# Altium schematic symbol library AD_Lib.SchLib: 1239 symbols (part 4 of 9)
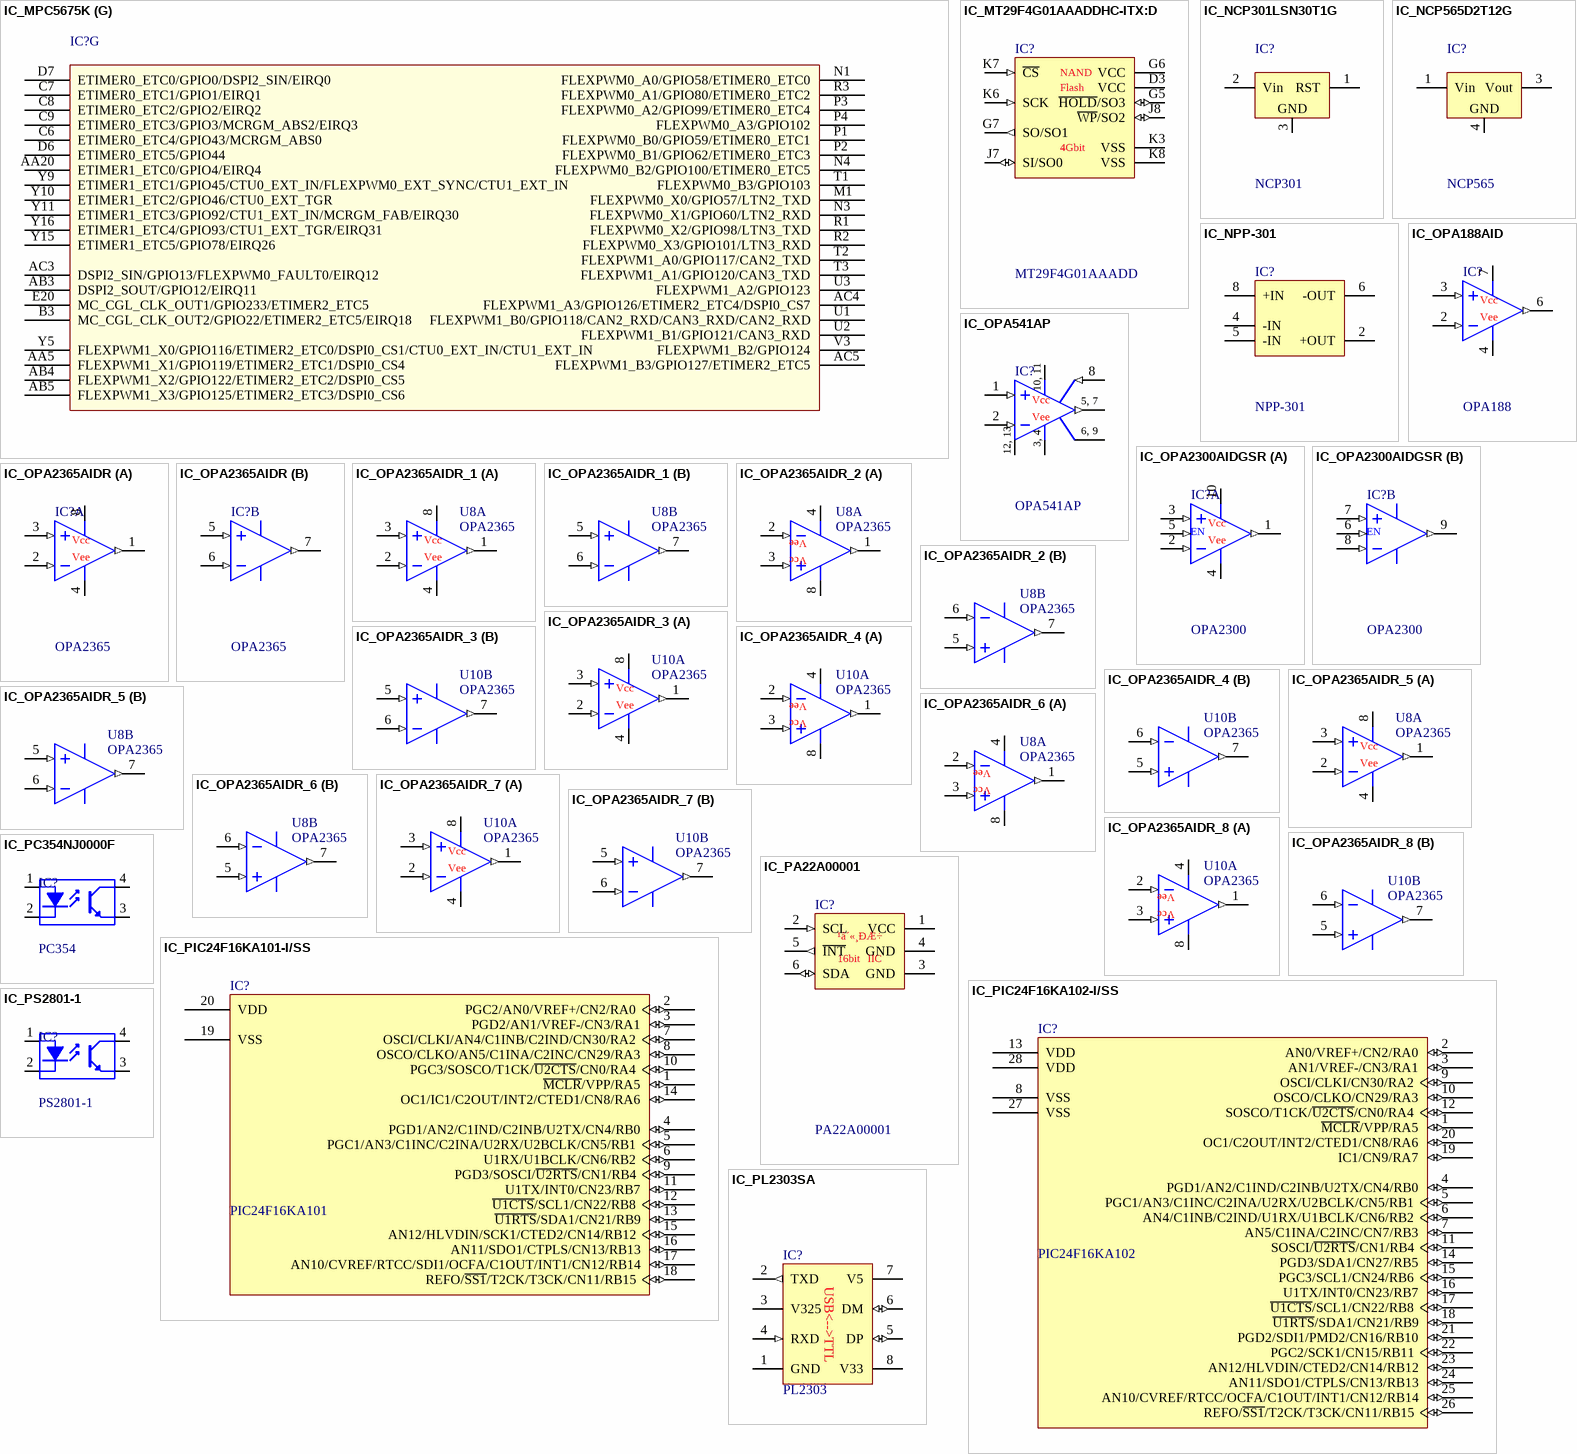
[diagram p45: symbols IC_MPC5675K to IC_PS2801-1]

## IC_MPC5675K
designator IC?, comment SPC5675
MCU; Manufacturer: Freescale; other: PowerPC Core,32bit; Value: 160MHz,3.3V; Quality: -40~125¡æ; pro-environment: RoHS; SN: 03.4.11.26.99567501S; OPN: SPC5675KFF0MMS2; PadsNum: 0; Category: ¼¯³ÉÐ¾Æ¬; Part: SPC5675; QTY: 420; Price: ?; OPN_JLC: OPN_JLC; SN_JLC: SN_JLC; Price_JLC: 0
footprint BGA-473 (BGA, 81-Leads, Body 19.0x19.0mm,  Pitch 0.80mm)
part A pins: A1 VSS_HV_IO, A2 VSS_HV_IO, A22 VSS_HV_IO, A23 VSS_HV_IO, AA3 VSS_HV_IO, AA10 VSS_HV_ADV, AA21 VSS_HV_IO, AB1 VSS_HV_IO, AB23 VSS_HV_IO, AC1 VSS_HV_IO, AC2 VSS_HV_IO, AC8 VSS_HV_ADR_23, AC13 VSS_HV_ADR_0, AC16 VSS_HV_ADR_1, AC19 VSS_HV_PMU, AC22 VSS_HV_IO, AC23 VSS_HV_IO, B1 VSS_HV_IO, B2 VSS_HV_IO, B14 VSS_HV_IO, B23 VSS_HV_IO, C3 VSS_HV_IO, C21 VSS_HV_PDI, D9 VSS_HV_IO, D12 VSS_HV_FLA, D17 VSS_HV_PDI, G7 VSS_LV_COR, G8 VSS_LV_COR, G9 VSS_LV_COR, G10 VSS_LV_COR, G11 VSS_LV_COR, G12 VSS_LV_COR, G13 VSS_LV_COR, G14 VSS_LV_COR, G15 VSS_LV_COR, G16 VSS_LV_COR, G17 VSS_LV_COR, H2 VSS_HV_IO, H7 VSS_LV_COR, H8 VSS_LV_COR, H9 VSS_LV_COR, H10 VSS_LV_COR, H11 VSS_LV_COR, H12 VSS_LV_COR, H13 VSS_LV_COR, H14 VSS_LV_COR, H15 VSS_LV_COR, H16 VSS_LV_COR, H17 VSS_LV_COR, H23 VSS_HV_DRAM, J7 VSS_LV_COR, J8 VSS_LV_COR, J9 VSS_LV_COR, J10 VSS_LV_COR, J11 VSS_LV_COR, J12 VSS_LV_COR, J13 VSS_LV_COR, J14 VSS_LV_COR, J15 VSS_LV_COR, J16 VSS_LV_COR, J17 VSS_LV_COR, K7 VSS_LV_COR, K8 VSS_LV_COR, K9 VSS_LV_COR, K10 VSS_LV_COR, K11 VSS_LV_COR, K12 VSS_LV_COR, K13 VSS_LV_COR, K14 VSS_LV_COR, K15 VSS_LV_COR, K16 VSS_LV_COR, K17 VSS_LV_COR, K20 VSS_HV_IO, L4 VSS_HV_IO, L7 VSS_LV_COR, L8 VSS_LV_COR, L9 VSS_LV_COR, L10 VSS_LV_COR, L11 VSS_LV_COR, L12 VSS_LV_COR, L13 VSS_LV_COR, L14 VSS_LV_COR, L15 VSS_LV_COR, L16 VSS_LV_COR, L17 VSS_LV_COR, L22 VSS_HV_DRAM, M7 VSS_LV_COR, M8 VSS_LV_COR, M9 VSS_LV_COR, M10 VSS_LV_COR, M11 VSS_LV_COR, M12 VSS_LV_COR, M13 VSS_LV_COR, M14 VSS_LV_COR, M15 VSS_LV_COR, M16 VSS_LV_COR, M17 VSS_LV_COR, N2 VSS_HV_IO, N7 VSS_LV_COR, N8 VSS_LV_COR, N9 VSS_LV_COR, N10 VSS_LV_COR, N11 VSS_LV_COR, N12 VSS_LV_COR, N13 VSS_LV_COR, N14 VSS_LV_COR, N15 VSS_LV_COR, N16 VSS_LV_COR, N17 VSS_LV_COR, P7 VSS_LV_COR, P8 VSS_LV_COR, P9 VSS_LV_COR, P10 VSS_LV_COR, P11 VSS_LV_COR, P12 VSS_LV_COR, P13 VSS_LV_COR, P14 VSS_LV_COR, P15 VSS_LV_COR, P16 VSS_LV_COR, P17 VSS_LV_COR, P22 VSS_HV_DRAM, R4 VSS_HV_IO, R7 VSS_LV_COR, R8 VSS_LV_COR, R9 VSS_LV_COR, R10 VSS_LV_COR, R11 VSS_LV_COR, R12 VSS_LV_COR, R13 VSS_LV_COR, R14 VSS_LV_COR, R15 VSS_LV_COR, R16 VSS_LV_COR, R17 VSS_LV_COR, T7 VSS_LV_COR, T8 VSS_LV_COR, T9 VSS_LV_COR, T10 VSS_LV_COR, T11 VSS_LV_COR, T12 VSS_LV_COR, T13 VSS_LV_COR, T14 VSS_LV_COR, T15 VSS_LV_COR, T16 VSS_LV_COR, T17 VSS_LV_COR, U7 VSS_LV_COR, U8 VSS_LV_COR, U9 VSS_LV_COR, U10 VSS_LV_COR, U11 VSS_LV_COR, U12 VSS_LV_COR, U13 VSS_LV_COR, U14 VSS_LV_COR, U15 VSS_LV_COR, U16 VSS_LV_COR, U17 VSS_LV_COR, V22 VSS_HV_DRAM, W2 VSS_HV_IO, W4 VSS_LV_PLL, Y1 VSS_HV_OSC, Y12 VSS_HV_IO
part B pins: A3 VDD_HV_IO, A14 VDD_HV_IO, AA9 VDD_HV_ADV, AB2 VDD_HV_IO, AB22 VDD_HV_IO, AC7 VDD_HV_ADR_23, AC12 VDD_HV_ADR_0, AC15 VDD_HV_ADR_1, AC17 VDD_HV_PMU, AC18 VREG_CTRL, AC20 RESET_SUPn (in), AC21 VREG_INT_ENABLEn (in), B22 VDD_HV_IO, C1 VDD_HV_IO, D8 VDD_HV_IO, D11 VPP_TEST, D13 VDD_HV_FLA, D16 VDD_HV_PDI, D20 VDD_HV_PDI, F6 VDD_LV_COR, F7 VDD_LV_COR, F8 VDD_LV_COR, F9 VDD_LV_COR, F10 VDD_LV_COR, F11 VDD_LV_COR, F12 VDD_LV_COR, F13 VDD_LV_COR, F14 VDD_LV_COR, F15 VDD_LV_COR, F16 VDD_LV_COR, F17 VDD_LV_COR, F18 VDD_LV_COR, G2 VDD_HV_IO, G6 VDD_LV_COR, G18 VDD_LV_COR, H6 VDD_LV_COR, H18 VDD_LV_COR, H21 VDD_HV_DRAM_VTT, H22 VDD_HV_DRAM, J6 VDD_LV_COR, J18 VDD_LV_COR, K6 VDD_LV_COR, K18 VDD_LV_COR, L6 VDD_LV_COR, L18 VDD_LV_COR, L20 VDD_HV_IO, L21 VDD_HV_DRAM_VTT, L23 VDD_HV_DRAM, M2 VDD_HV_IO, M4 VDD_HV_IO, M6 VDD_LV_COR, M18 VDD_LV_COR, N6 VDD_LV_COR, N18 VDD_LV_COR, P6 VDD_LV_COR, P18 VDD_LV_COR, P23 VDD_HV_DRAM, R6 VDD_LV_COR, R18 VDD_LV_COR, R20 VDD_HV_DRAM_VREF, T4 VDD_HV_IO, T6 VDD_LV_COR, T18 VDD_LV_COR, U6 VDD_LV_COR, U18 VDD_LV_COR, U22 VDD_HV_DRAM, V1 VDD_HV_OSC, V2 VDD_HV_IO, V6 VDD_LV_COR, V7 VDD_LV_COR, V8 VDD_LV_COR, V9 VDD_LV_COR, V10 VDD_LV_COR, V11 VDD_LV_COR, V12 VDD_LV_COR, V13 VDD_LV_COR, V14 VDD_LV_COR, V15 VDD_LV_COR, V16 VDD_LV_COR, V17 VDD_LV_COR, V18 VDD_LV_COR, Y4 VDD_LV_PLL, Y13 VDD_HV_IO, Y20 VDD_HV_IO
part C pins: A4 NPC_MDO[5]/GPIO114, A5 NPC_MDO[7]/GPIO112, A6 NPC_MDO[9]/GPIO110, AA1 XTALOUT, AA2 FCCU0_F0, AA19 TDI, AB18 TDO, AB19 TMS, AB20 RESERVED2, B5 NPC_MDO[14]/GPIO219/CAN3_TXD, C2 NPC_MDO[15]/GPIO220/CAN3_RXD/CAN2_RXD, C4 FCCU0_F1, D1 NPC_MDO[1]/GPIO86, D2 NPC_MDO[3]/GPIO84, D5 RESERVED1, D10 JCOMP, E1 NPC_MDO[0], E2 NPC_MDO[2]/GPIO85, E4 NMI, F1 NPC_MDO[10]/GPIO109, F2 NPC_MDO[11]/GPIO108, F3 NPC_MDO[6]/GPIO113, F4 NPC_MDO[4]/GPIO115, G1 NPC_MCKO/GPIO87, G3 NPC_MDO[8]/GPIO111, G4 NPC_MSEO_B1/GPIO88, H1 NPC_EVTOn/GPIO90, H3 NPC_MSEO_B0/GPIO89, H4 NPC_EVTIn/GPIO91, J1 NPC_RDYn/GPIO216, J2 NPC_MDO[13]/GPIO218/CAN2_RXD/CAN3_RXD, J3 NPC_MDO[12]/GPIO217/CAN2_TXD, W1 XTALIN, Y2 RESETn, Y19 TCK
part D pins: AA6 ADC3_AN1/GPI230, AA7 ADC2_3_AN12/GPI226, AA8 ADC2_AN0/GPI221, AA11 ADC0_AN2/GPI33, AA12 ADC0_AN5/GPI66, AA13 ADC0_AN8/GPI69, AA14 ADC0_1_AN12/GPI26, AA15 ADC1_AN0/GPI29/LIN1_RXD, AA16 ADC1_AN2/GPI31//EIRQ20, AA17 ADC1_AN5/GPI64, AA18 ADC1_AN7/GPI73, AB6 ADC3_AN2/GPI231, AB7 ADC2_3_AN13/GPI227, AB8 ADC2_AN1/GPI222, AB9 ADC2_AN2/GPI223, AB10 ADC0_AN0/GPI23/LIN0_RXD, AB11 ADC0_AN4/GPI70, AB12 ADC0_AN6/GPI71, AB13 ADC0_AN7/GPI68, AB14 ADC0_1_AN13/GPI27, AB15 ADC1_AN1/GPI30/ETIMER0_ETC4/EIRQ19, AB16 ADC1_AN3/GPI32, AB17 ADC1_AN4/GPI75, AC6 ADC3_AN3/GPI232, AC9 ADC2_AN3/GPI224, AC10 ADC0_AN1/GPI24/ETIMER0_ETC5, AC11 ADC0_AN3/GPI34, AC14 ADC0_1_AN14/GPI28, Y6 ADC3_AN0/GPI229, Y7 ADC2_3_AN11/GPI225, Y8 ADC2_3_AN14/GPI228, Y14 ADC0_1_AN11/GPI25, Y17 ADC1_AN8/GPI74, Y18 ADC1_AN6/GPI76
part E pins: A7 FLEXRAY_CB_TX/GPIO51, A8 FLEXRAY_CA_TR_EN/GPIO47/CTU0_EXT_IN/FLEXPWM0_EXT_SYNC, A9 FEC_RX_DV, A10 FEC_MDIO, A11 FEC_TX_CLK, A12 FEC_TX_EN, A13 FEC_TXD3, AA4 DSPI1_CS3/GPIO55/LIN2_TXD/DSPI0_CS4, AA22 LIN1_TXD/GPIO94/I2C1_CLOCK, AB21 LIN1_RXD/GPIO95/I2C1_DATA, B4 CAN1_TXD/GPIO14/EIRQ13, B6 DSPI2_CS1/GPIO9/FLEXPWM0_FAULT0/LIN3_RXD/CAN2_RXD, B7 FLEXRAY_CB_TR_EN/GPIO52, B8 FLEXRAY_CA_TX/GPIO48/CTU1_EXT_IN, B9 FEC_RXD3, B10 FEC_RX_ER, B11 FEC_TXD0, B12 FEC_RXD0, B13 FEC_TX_ER, B21 CAN0_TXD/GPIO16/SSCM_DEBUG0/EIRQ15, C5 FLEXRAY_CB_RX/GPIO50/CTU1_EXT_TGR, C10 FEC_TXD2, C11 FEC_TXD1, C12 FEC_CRS, C13 FEC_RX_CLK, C14 FEC_RXD1, C15 FEC_COL, C20 CAN0_RXD/GPIO17/SSCM_DEBUG1/CAN1_RXD/EIRQ16, D3 CAN1_RXD/GPIO15/CAN0_RXD/EIRQ14, D4 DSPI0_SOUT/GPIO38/SSCM_DEBUG6/EIRQ24, D14 FEC_RXD2, D15 FEC_MDO, E3 FLEXRAY_CA_RX/GPIO49/CTU0_EXT_TGR, J4 DSPI1_SIN/GPIO8/EIRQ8, K1 DSPI0_SCK/GPIO37/SSCM_DEBUG5/FLEXPWM0_FAULT3/EIRQ23, K2 DSPI1_CS0/GPIO5/DSPI0_CS7/EIRQ5, K3 DSPI1_SCK/GPIO6/EIRQ6, K4 DSPI1_SOUT/GPIO7/EIRQ7, L1 DSPI0_CS0/GPIO36/SSCM_DEBUG4/EIRQ22, L2 DSPI2_CS2/GPIO942/LIN3_TXD/CAN2_TXD/FLEXPWM0_FAULT1, L3 DSPI2_CS0/GPIO10/CAN3_TXD/EIRQ9, M3 DSPI0_SIN/GPIO39/SSCM_DEBUG7, U4 DSPI2_SCK/GPIO11/CAN3_RXD/EIRQ10, V4 DSPI1_CS2/GPIO56/DSPI0_CS5/FLEXPWM0_FAULT3/LIN2_RXD, V20 LIN0_TXD/GPIO18/I2C0_CLOCK/SSCM_DEBUG2/EIRQ17, W3 DSPI0_CS3/GPIO53/I2C2_CLOCK/FLEXPWM0_FAULT2, W20 LIN0_RXD/GPIO19/I2C0_DATA/SSCM_DEBUG3, Y3 DSPI0_CS2/GPIO54/I2C2_DATA/FLEXPWM0_FAULT1
part F pins: A15 PDI_DATA3/GPIO134/FLEXPWM2_X1, A16 PDI_DATA1/GPIO132/FLEXPWM2_B3, A17 PDI_CLOCK/GPIO128/FLEXPWM2_B1/ETIMER1_ETC3, A18 PDI_DATA7/GPIO138/FLEXPWM2_B2/ETIMER1_ETC5, A19 PDI_DATA10/GPIO141/FLEXPWM2_X3, A20 PDI_DATA13/GPIO144/PDI_SENS_SEL2/CTU1_EXT_TGR, A21 PDI_DATA15/GPIO146/PDI_SENS_SEL0/I2C2_DATA/CTU1_EXT_IN, AA23 DRAMC_ADD10/GPIO168/EBI_D2/EBI_ADD18, B15 PDI_DATA6/GPIO137/FLEXPWM2_B0/ETIMER1_ETC1, B16 PDI_DATA4/GPIO135/FLEXPWM2_A2/ETIMER1_ETC4, B17 PDI_DATA0/GPIO131/LIN3_TXD/FLEXPWM2_FAULT2, B18 PDI_LINE_V/GPIO129/LIN2_TXD/FLEXPWM2_FAULT0, B19 PDI_DATA9/GPIO140/FLEXPWM2_X2, B20 PDI_DATA14/GPIO145/PDI_SENS_SEL1/I2C2_COLCK, C16 PDI_DATA5/GPIO136/FLEXPWM2_A0/ETIMER1_ETC0, C17 PDI_DATA2/GPIO133/FLEXPWM2_A1/ETIMER1_ETC2, C18 PDI_DATA8/GPIO139/FLEXPWM2_A3, C19 PDI_DATA12/GPIO143/LIN3_RXD/FLEXPWM2_FAULT3, C22 GPIO197/FLEXPWM0_X0/EBI_D31, C23 DRAMC_CAS/GPIO152/EBI_WE_BE_1/FLEXPWM0_B2, D18 PDI_DATA11/GPIO142/FLEXPWM2_X0, D19 PDI_FRAME_V/GPIO130/LIN2_RXD/FLEXPWM2_FAULT1, D21 DRAMC_BA1/GPIO155/EBI_BDIP/FLEXPWM1_A0, D22 GPIO195/FLEXPWM0_X0/EBI_D29, D23 DRAMC_BA0/GPIO154/EBI_WE_BE_3/FLEXPWM0_B3, E21 GPIO149/EBI_RD_WR/FLEXPWM0_A1, E22 DRAMC_CS0/GPIO150/EBI_TS/FLEXPWM0_B1, E23 DRAMC_BA2/GPIO156/EBI_CS0/FLEXPWM1_B0, F20 DRAMC_RAS/GPIO151/EBI_WE_BE_0/FLEXPWM0_A2, F21 GPIO194/FLEXPWM0_X0/EBI_D28, F22 GPIO148/EBI_CLKOUT/FLEXPWM0_B0, F23 DRAMC_D5/GPIO179/EBI_D13/EBI_ADD29, G20 GPIO196/FLEXPWM0_X0/EBI_D30, G21 DRAMC_DQS0/GPIO190/EBI_D24, G22 DRAMC_DM0/GPIO192/EBI_D26, G23 DRAMC_D7/GPIO181/EBI_D15/EBI_ADD31, H20 DRAMC_D2/GPIO176/EBI_D10/EBI_ADD26, J20 DRAMC_D0/GPIO174/EBI_D8/EBI_ADD24, J21 DRAMC_D1/GPIO175/EBI_D9/EBI_ADD25, J22 DRAMC_D3/GPIO177/EBI_D11/EBI_ADD27, J23 DRAMC_D6/GPIO180/EBI_D14/EBI_ADD30, K21 DRAMC_D4/GPIO178/EBI_D12/EBI_ADD28, K22 DRAMC_D8/GPIO182/EBI_D16, K23 DRAMC_D9/GPIO183/EBI_D17, M20 DRAMC_ODT/GPIO157/EBI_CS1/FLEXPWM1_A1, M21 DRAMC_WEB/GPIO153/EBI_WE_BE_2/FLEXPWM0_A3, M22 DRAMC_D11/GPIO185/EBI_D19, M23 DRAMC_D10/GPIO184/EBI_D18, N20 DRAMC_DQS1/GPIO191/EBI_D25, N21 DRAMC_DM1/GPIO193/EBI_D27, N22 DRAMC_D13/GPIO187/EBI_D21, N23 DRAMC_D12/GPIO186/EBI_D20, P20 DRAMC_D14/GPIO188/EBI_D22, P21 DRAMC_D15/GPIO189/EBI_D23, R21 DRAMC_ADD3/GPIO161/EBI_ADD11/EBI_TEA, R22 DRAMC_CKE/GPIO147/EBI_OE/FLEXPWM0_A0, R23 DRAMC_CLKn, T20 DRAMC_ADD8/GPIO166/EBI_D0/EBI_ADD16, T21 DRAMC_ADD9/GPIO167/EBI_D1/EBI_ADD17, T22 DRAMC_ADD1/GPIO159/EBI_ADD9/EBI_CS3, T23 DRAMC_CLK, U20 DRAMC_ADD6/GPIO164/EBI_ADD14/FLEXPWM1_A2, U21 DRAMC_ADD12/GPIO170/EBI_D4/EBI_ADD20, U23 DRAMC_ADD0/GPIO158/EBI_ADD8/EBI_CS2, V21 DRAMC_ADD13/GPIO171/EBI_D5/EBI_ADD21, V23 DRAMC_ADD2/GPIO160/EBI_ADD10/EBI_TA, W21 DRAMC_ADD14/GPIO172/EBI_D6/EBI_ADD22, W22 DRAMC_ADD7/GPIO165/EBI_ADD15/FLEXPWM1_B2, W23 DRAMC_ADD4/GPIO162/EBI_ADD12/EBI_ALE, Y21 DRAMC_ADD15/GPIO173/EBI_D7/EBI_ADD23, Y22 DRAMC_ADD11/GPIO169/EBI_D3/EBI_ADD19, Y23 DRAMC_ADD5/GPIO163/EBI_ADD13/FLEXPWM1_B1
part G pins: AA5 FLEXPWM1_X1/GPIO119/ETIMER2_ETC1/DSPI0_CS4, AA20 ETIMER1_ETC0/GPIO4/EIRQ4, AB3 DSPI2_SOUT/GPIO12/EIRQ11, AB4 FLEXPWM1_X2/GPIO122/ETIMER2_ETC2/DSPI0_CS5, AB5 FLEXPWM1_X3/GPIO125/ETIMER2_ETC3/DSPI0_CS6, AC3 DSPI2_SIN/GPIO13/FLEXPWM0_FAULT0/EIRQ12, AC4 FLEXPWM1_A3/GPIO126/ETIMER2_ETC4/DSPI0_CS7, AC5 FLEXPWM1_B3/GPIO127/ETIMER2_ETC5, B3 MC_CGL_CLK_OUT2/GPIO22/ETIMER2_ETC5/EIRQ18, C6 ETIMER0_ETC4/GPIO43/MCRGM_ABS0, C7 ETIMER0_ETC1/GPIO1/EIRQ1, C8 ETIMER0_ETC2/GPIO2/EIRQ2, C9 ETIMER0_ETC3/GPIO3/MCRGM_ABS2/EIRQ3, D6 ETIMER0_ETC5/GPIO44, D7 ETIMER0_ETC0/GPIO0/DSPI2_SIN/EIRQ0, E20 MC_CGL_CLK_OUT1/GPIO233/ETIMER2_ETC5, M1 FLEXPWM0_X0/GPIO57/LTN2_TXD, N1 FLEXPWM0_A0/GPIO58/ETIMER0_ETC0, N3 FLEXPWM0_X1/GPIO60/LTN2_RXD, N4 FLEXPWM0_B2/GPIO100/ETIMER0_ETC5, P1 FLEXPWM0_B0/GPIO59/ETIMER0_ETC1, P2 FLEXPWM0_B1/GPIO62/ETIMER0_ETC3, P3 FLEXPWM0_A2/GPIO99/ETIMER0_ETC4, P4 FLEXPWM0_A3/GPIO102, R1 FLEXPWM0_X2/GPIO98/LTN3_TXD, R2 FLEXPWM0_X3/GPIO101/LTN3_RXD, R3 FLEXPWM0_A1/GPIO80/ETIMER0_ETC2, T1 FLEXPWM0_B3/GPIO103, T2 FLEXPWM1_A0/GPIO117/CAN2_TXD, T3 FLEXPWM1_A1/GPIO120/CAN3_TXD, U1 FLEXPWM1_B0/GPIO118/CAN2_RXD/CAN3_RXD/CAN2_RXD, U2 FLEXPWM1_B1/GPIO121/CAN3_RXD, U3 FLEXPWM1_A2/GPIO123, V3 FLEXPWM1_B2/GPIO124, Y5 FLEXPWM1_X0/GPIO116/ETIMER2_ETC0/DSPI0_CS1/CTU0_EXT_IN/CTU1_EXT_IN, Y9 ETIMER1_ETC1/GPIO45/CTU0_EXT_IN/FLEXPWM0_EXT_SYNC/CTU1_EXT_IN, Y10 ETIMER1_ETC2/GPIO46/CTU0_EXT_TGR, Y11 ETIMER1_ETC3/GPIO92/CTU1_EXT_IN/MCRGM_FAB/EIRQ30, Y15 ETIMER1_ETC5/GPIO78/EIRQ26, Y16 ETIMER1_ETC4/GPIO93/CTU1_EXT_TGR/EIRQ31

## IC_MT29F4G01AAADDHC-ITX:D
designator IC?, comment MT29F4G01AAADD
NAND Flash£¬4Gbit; Manufacturer: Micron; pro-environment: RoHS; Quality: -40~85¡æ; SN: 03.4.11.16.75MT2901S; Value: 4Gbit,2.7 V~3.6 V; OPN: MT29F4G01AAADDHCIT; PadsNum: 0; Category: ¼¯³ÉÐ¾Æ¬; Part: MT29F4G01AAADD; Price: ?; OPN_JLC: OPN_JLC; SN_JLC: SN_JLC; Price_JLC: 0
footprint VFBGA-63 (BGA, 63-Leads, Body 13.0x10.5mm,  Pitch 0.80mm)
pins: D3 VCC (power), G5 ~{HOLD}/SO3 (io), G6 VCC (power), G7 SO/SO1 (out), J7 SI/SO0 (io), J8 ~{WP}/SO2 (io), K3 VSS (power), K6 SCK (in), K7 ~{CS} (in), K8 VSS (power)
text: NAND; Flash; 4Gbit

## IC_NCP301LSN30T1G
designator IC?, comment NCP301
µçÔ´¼àÊÓ,3V; Manufacturer: ON; pro-environment: RoHS; Quality: -40~85¡æ; SN: 03.4.11.11.49301L01S; Value: 2.94~3.06V; OPN: NCP301LSN30T1G; PadsNum: 0; Category: ¼¯³ÉÐ¾Æ¬; Part: NCP301; QTY: 3000; Price: 1.2519; OPN_JLC: OPN_JLC; SN_JLC: SN_JLC; Price_JLC: 0
footprint SOT23-5 (SOT23, 5-Leads, Body 2.9x1.6mm, Pitch 0.95mm, Lead Span 2.7mm, IPC Low Density)
pins: 1 RST, 2 Vin, 3 GND (power)

## IC_NCP565D2T12G
designator IC?, comment NCP565
ÎÈÑ¹Ð¾Æ¬,LDO,1.2V/1.5A; Manufacturer: ON; pro-environment: RoHS; Quality: -40~125¡æ; Value: 9V,1.5A; OPN: NCP565D2T12G; PadsNum: 0; SN: SN; Category: ¼¯³ÉÐ¾Æ¬; Part: NCP565; QTY: 50; Price: 10.8342; OPN_JLC: OPN_JLC; SN_JLC: SN_JLC; Price_JLC: 0
footprint TO252-3 (D-PAK, 4-Leads, Body 6.1x6.5mm, Pitch 2.28mm, Lead Span 9.8mm, IPC Low Density)
pins: 1 Vin, 3 Vout, 4 GND (power)

## IC_NPP-301
designator IC?, comment NPP-301
Ñ¹Á¦´«¸ÐÆ÷; Pmax = 100psi; 0.1%; Vmax=60mV; Manufacturer: Amphenol; Quality: -40~125¡æ; Value: 100psi, 0.1%; pro-environment: RoHS; other: 100psi;0.1%;60mV; OPN: NPP-301A-700AT; PadsNum: 0; SN: SN; Category: ¼¯³ÉÐ¾Æ¬; Part: NPP-301; QTY: 2000; Price: 34.3592; OPN_JLC: OPN_JLC; SN_JLC: SN_JLC; Price_JLC: 0
footprint SO-8 (SOIC, 8-Leads, Body 4.9x3.9mm, Pitch 1.27mm, IPC Low Density)
pins: 2 +OUT, 4 -IN, 5 -IN, 6 -OUT, 8 +IN

## IC_OPA188AID
designator IC?, comment OPA188
OPA;1P;Io=18mA; Manufacturer: TI; Quality: -40~125¡æ; Value: 4V~36V;18mA; pro-environment: RoHS; other: Io=18mA;SR=0.8V/us; OPN: OPA188AID; PadsNum: 0; SN: SN; Category: ¼¯³ÉÐ¾Æ¬; Part: OPA188; QTY: 75; Price: 18.758; OPN_JLC: OPA188AIDR; SN_JLC: C85166; Price_JLC: 5.48
footprint SO-8 (SOIC, 8-Leads, Body 4.9x3.9mm, Pitch 1.27mm, IPC Low Density)
pins: 2 IN- (in), 3 IN+ (in), 4 VEE (power), 6 OUT (out), 7 VCC (power)
text: Vcc; Vee

## IC_OPA541AP
designator IC?, comment OPA541AP
¹¦ÂÊÔË·Å; Io=5A; 20~70V; Manufacturer: TI; Quality: -25~85¡æ; Value: 20V~70V; pro-environment: RoHS; other: Io=5A;SR=10V/us; PadsNum: 0; SN: SN; Category: ¼¯³ÉÐ¾Æ¬; OPN: OPA541AP; Part: OPA541AP; QTY: 25; Price: 155.7972; OPN_JLC: OPN_JLC; SN_JLC: SN_JLC; Price_JLC: 0
footprint TO220-11_HT (TO, Thru-Hole, Vertical, Heatsink Mounted; 11 Bent Staggered Leads; Pitch 1.7 mm)
pins: 1 IN+ (in), 2 IN- (in), 3 V- (power), 4 V- (power), 5 O DRV (out), 6 NC, 7 O DRV (out), 8 ISEN (in), 9 NC, 10 +V (power), 11 +V (power), 12, 13
text: 10, 11; Vcc; 5, 7; Vee; 6, 9; 3, 4; 12, 13

## IC_OPA2300AIDGSR
designator IC?, comment OPA2300
OPA; 2P; 80V/us; Io=9.5mA; Manufacturer: TI; Quality: -40~85¡æ; Value: 2.7V~5.5V; pro-environment: RoHS; other: Io=9.5mA;SR=80V/us; OPN: OPA2300AIDGSR; PadsNum: 0; SN: SN; Category: ¼¯³ÉÐ¾Æ¬; Part: OPA2300; QTY: 2500; Price: 9.0626; OPN_JLC: OPN_JLC; SN_JLC: SN_JLC; Price_JLC: 0
footprint VSSOP-10 (Shrink Small Outline; 10 Leads; Body Width 3 mm; Pitch 0.5 mm)
part A pins: 1 OUTA (out), 2 INA- (in), 3 INA+ (in), 4 VEE (power), 5 EA (in), 10 VCC (power)
part B pins: 6 ENB (in), 7 INB+ (in), 8 INB- (in), 9 OUTB (out)
part A text: Vcc; EN; Vee
part B text: EN

## IC_OPA2365AIDR
designator IC?, comment OPA2365
OPA; 2P; Vi=2.2~5.5V; Io=65mA; SR=25V/us; Manufacturer: TI; Quality: -40~85¡æ; pro-environment: RoHS; OPN: OPA2365AIDR; PadsNum: 8; Value: 2.2~5.5V; SN: SN; other: Io=65mA;SR=25V/us; Category: ¼¯³ÉÐ¾Æ¬; Part: OPA2365; QTY: 2500; Price: 8.4072; OPN_JLC: OPA2365AIDR; SN_JLC: C130011; Price_JLC: 5.03
footprint SO-8 (SOIC, 8-Leads, Body 4.9x3.9mm, Pitch 1.27mm, IPC Low Density)
part A pins: 1 OUTA (out), 2 INA- (in), 3 INA+ (in), 4 VEE (power), 8 VCC (power)
part B pins: 5 INB+ (in), 6 INB- (in), 7 OUTB (out)
part A text: Vcc; Vee

## IC_OPA2365AIDR_1
designator U8, comment OPA2365
OPA; 2P; Vi=2.2~5.5V; Io=65mA; SR=25V/us; Manufacturer: TI; Quality: -40~85¡æ; pro-environment: RoHS; OPN: OPA2365AIDR; PadsNum: 8; Value: 2.2~5.5V; SN: SN; other: Io=65mA;SR=25V/us; Category: ¼¯³ÉÐ¾Æ¬; Part: OPA2365; QTY: 2500; Price: 8.4072; OPN_JLC: OPA2365AIDR; SN_JLC: C130011; Price_JLC: 5.03
footprint SO-8 (SOIC, 8-Leads, Body 4.9x3.9mm, Pitch 1.27mm, IPC Low Density)
part A pins: 1 OUTA (out), 2 INA- (in), 3 INA+ (in), 4 VEE (power), 8 VCC (power)
part B pins: 5 INB+ (in), 6 INB- (in), 7 OUTB (out)
part A text: Vcc; Vee

## IC_OPA2365AIDR_2
designator U8, comment OPA2365
OPA; 2P; Vi=2.2~5.5V; Io=65mA; SR=25V/us; Manufacturer: TI; Quality: -40~85¡æ; pro-environment: RoHS; OPN: OPA2365AIDR; PadsNum: 8; Value: 2.2~5.5V; SN: SN; other: Io=65mA;SR=25V/us; Category: ¼¯³ÉÐ¾Æ¬; Part: OPA2365; QTY: 2500; Price: 8.4072; OPN_JLC: OPA2365AIDR; SN_JLC: C130011; Price_JLC: 5.03
footprint SO-8 (SOIC, 8-Leads, Body 4.9x3.9mm, Pitch 1.27mm, IPC Low Density)
part A pins: 1 OUTA (out), 2 INA- (in), 3 INA+ (in), 4 VEE (power), 8 VCC (power)
part B pins: 5 INB+ (in), 6 INB- (in), 7 OUTB (out)
part A text: Vee; Vcc

## IC_OPA2365AIDR_3
designator U10, comment OPA2365
OPA; 2P; Io=0.31A; Manufacturer: TI; Quality: -40~85¡æ; Value: ¡À1.5V~¡À12V;3V~24V;; pro-environment: RoHS; other: Io=310mA;SR=53V/us; OPN: OPA2365AIDR; PadsNum: 8; SN: SN; Category: ¼¯³ÉÐ¾Æ¬; Part: OPA2365; QTY: 98; Price: ?; OPN_JLC: OPA2365AIDR; SN_JLC: C130011; Price_JLC: 5.03
footprint SO-8 (SOIC, 8-Leads, Body 4.9x3.9mm, Pitch 1.27mm, IPC Low Density)
part A pins: 1 OUTA (out), 2 INA- (in), 3 INA+ (in), 4 VEE (power), 8 VCC (power)
part B pins: 5 INB+ (in), 6 INB- (in), 7 OUTB (out)
part A text: Vcc; Vee

## IC_OPA2365AIDR_4
designator U10, comment OPA2365
OPA; 2P; Io=0.31A; Manufacturer: TI; Quality: -40~85¡æ; Value: ¡À1.5V~¡À12V;3V~24V;; pro-environment: RoHS; other: Io=310mA;SR=53V/us; OPN: OPA2365AIDR; PadsNum: 8; SN: SN; Category: ¼¯³ÉÐ¾Æ¬; Part: OPA2365; QTY: 98; Price: ?; OPN_JLC: OPA2365AIDR; SN_JLC: C130011; Price_JLC: 5.03
footprint SO-8 (SOIC, 8-Leads, Body 4.9x3.9mm, Pitch 1.27mm, IPC Low Density)
part A pins: 1 OUTA (out), 2 INA- (in), 3 INA+ (in), 4 VEE (power), 8 VCC (power)
part B pins: 5 INB+ (in), 6 INB- (in), 7 OUTB (out)
part A text: Vee; Vcc

## IC_OPA2365AIDR_5
designator U8, comment OPA2365
OPA; 2P; Vi=2.2~5.5V; Io=65mA; SR=25V/us; Manufacturer: TI; Quality: -40~85¡æ; pro-environment: RoHS; OPN: OPA2365AIDR; PadsNum: 8; Value: 2.2~5.5V; SN: SN; other: Io=65mA;SR=25V/us; Category: ¼¯³ÉÐ¾Æ¬; Part: OPA2365; QTY: 2500; Price: 8.4072; OPN_JLC: OPA2365AIDR; SN_JLC: C130011; Price_JLC: 5.03
footprint SO-8 (SOIC, 8-Leads, Body 4.9x3.9mm, Pitch 1.27mm, IPC Low Density)
part A pins: 1 OUTA (out), 2 INA- (in), 3 INA+ (in), 4 VEE (power), 8 VCC (power)
part B pins: 5 INB+ (in), 6 INB- (in), 7 OUTB (out)
part A text: Vcc; Vee

## IC_OPA2365AIDR_6
designator U8, comment OPA2365
OPA; 2P; Vi=2.2~5.5V; Io=65mA; SR=25V/us; Manufacturer: TI; Quality: -40~85¡æ; pro-environment: RoHS; OPN: OPA2365AIDR; PadsNum: 8; Value: 2.2~5.5V; SN: SN; other: Io=65mA;SR=25V/us; Category: ¼¯³ÉÐ¾Æ¬; Part: OPA2365; QTY: 2500; Price: 8.4072; OPN_JLC: OPA2365AIDR; SN_JLC: C130011; Price_JLC: 5.03
footprint SO-8 (SOIC, 8-Leads, Body 4.9x3.9mm, Pitch 1.27mm, IPC Low Density)
part A pins: 1 OUTA (out), 2 INA- (in), 3 INA+ (in), 4 VEE (power), 8 VCC (power)
part B pins: 5 INB+ (in), 6 INB- (in), 7 OUTB (out)
part A text: Vee; Vcc

## IC_OPA2365AIDR_7
designator U10, comment OPA2365
OPA; 2P; Io=0.31A; Manufacturer: TI; Quality: -40~85¡æ; Value: ¡À1.5V~¡À12V;3V~24V;; pro-environment: RoHS; other: Io=310mA;SR=53V/us; OPN: OPA2365AIDR; PadsNum: 8; SN: SN; Category: ¼¯³ÉÐ¾Æ¬; Part: OPA2365; QTY: 98; Price: ?; OPN_JLC: OPA2365AIDR; SN_JLC: C130011; Price_JLC: 5.03
footprint SO-8 (SOIC, 8-Leads, Body 4.9x3.9mm, Pitch 1.27mm, IPC Low Density)
part A pins: 1 OUTA (out), 2 INA- (in), 3 INA+ (in), 4 VEE (power), 8 VCC (power)
part B pins: 5 INB+ (in), 6 INB- (in), 7 OUTB (out)
part A text: Vcc; Vee

## IC_OPA2365AIDR_8
designator U10, comment OPA2365
OPA; 2P; Io=0.31A; Manufacturer: TI; Quality: -40~85¡æ; Value: ¡À1.5V~¡À12V;3V~24V;; pro-environment: RoHS; other: Io=310mA;SR=53V/us; OPN: OPA2365AIDR; PadsNum: 8; SN: SN; Category: ¼¯³ÉÐ¾Æ¬; Part: OPA2365; QTY: 98; Price: ?; OPN_JLC: OPA2365AIDR; SN_JLC: C130011; Price_JLC: 5.03
footprint SO-8 (SOIC, 8-Leads, Body 4.9x3.9mm, Pitch 1.27mm, IPC Low Density)
part A pins: 1 OUTA (out), 2 INA- (in), 3 INA+ (in), 4 VEE (power), 8 VCC (power)
part B pins: 5 INB+ (in), 6 INB- (in), 7 OUTB (out)
part A text: Vee; Vcc

## IC_PA22A00001
designator IC?, comment PA22A00001
¹â´«¸ÐÆ÷; 16bit; 2.7~3.3V; I2C;; Manufacturer: TXC; pro-environment: RoHS; Quality: -40~85¡æ; Value: 16bit,2.7~3.3V,IIC; PadsNum: 0; SN: SN; Category: ¼¯³ÉÐ¾Æ¬; OPN: PA22A00001; Part: PA22A00001; QTY: 3000; other: ¹â´«¸ÐÆ÷; 16bit; 2.7~3.3V; I2C;; Price: 1.2; OPN_JLC: OPN_JLC; SN_JLC: SN_JLC; Price_JLC: 0
footprint PA22A00001 (TXCÖ®¹â´«¸ÐÆ÷)
pins: 1 VCC (power), 2 SCL (in), 3 GND (power), 4 GND (power), 5 ~{INT} (out), 6 SDA (io)
text: ¹â´«¸ÐÆ÷; 16bit; IIC

## IC_PC354NJ0000F
designator IC?, comment PC354
¹âñî; 80V; 1mA; 18us/18us; Manufacturer: Sharp; pro-environment: RoHS; Quality: -55~100¡æ; OPN: PC354NJ0000F; PadsNum: 4; SN: SN; Value: 18us/18us; Category: ¼¯³ÉÐ¾Æ¬; Part: PC354; QTY: 3000; Price: 2.147; OPN_JLC: PC354NJ0000F; SN_JLC: C114904; Price_JLC: 1.56
footprint SO-4W (Pitch=100mil£¬ÈçHCPL-181)
pins: 1 A "Anode", 2 K "Cathode", 3 E "Emitter", 4 C "Collector"

## IC_PIC24F16KA101-I/SS
designator IC?, comment PIC24F16KA101
MCU; 16bit; 32MHz; 16 KB Flash; 1.5 KB RAM; Manufacturer: Microchip; pro-environment: RoHS; Quality: -40~85¡æ; Value: 16bit MCU;32MHz;16 KB Flash, 1.5 KB RAM; OPN: PIC24F16KA101-I/SS; PadsNum: 0; SN: SN; Category: ¼¯³ÉÐ¾Æ¬; Part: PIC24F16KA101; QTY: 47; Price: 16.5204; OPN_JLC: OPN_JLC; SN_JLC: SN_JLC; Price_JLC: 0
footprint SSOP-20_W5.3 (SOP, 20-Leads, Body 7.2x5.3mm, Pitch 0.65mm, IPC Low Density)
pins: 1 ~{MCLR}/VPP/RA5 (io), 2 PGC2/AN0/VREF+/CN2/RA0 (io), 3 PGD2/AN1/VREF-/CN3/RA1 (io), 4 PGD1/AN2/C1IND/C2INB/U2TX/CN4/RB0 (io), 5 PGC1/AN3/C1INC/C2INA/U2RX/U2BCLK/CN5/RB1 (io), 6 U1RX/U1BCLK/CN6/RB2 (io), 7 OSCI/CLKI/AN4/C1INB/C2IND/CN30/RA2 (io), 8 OSCO/CLKO/AN5/C1INA/C2INC/CN29/RA3 (io), 9 PGD3/SOSCI/~{U2RTS}/CN1/RB4 (io), 10 PGC3/SOSCO/T1CK/~{U2CTS}/CN0/RA4 (io), 11 U1TX/INT0/CN23/RB7 (io), 12 ~{U1CTS}/SCL1/CN22/RB8 (io), 13 ~{U1RTS}/SDA1/CN21/RB9 (io), 14 OC1/IC1/C2OUT/INT2/CTED1/CN8/RA6 (io), 15 AN12/HLVDIN/SCK1/CTED2/CN14/RB12 (io), 16 AN11/SDO1/CTPLS/CN13/RB13 (io), 17 AN10/CVREF/RTCC/SDI1/OCFA/C1OUT/INT1/CN12/RB14 (io), 18 REFO/~{SS1}/T2CK/T3CK/CN11/RB15 (io), 19 VSS (power), 20 VDD (power)

## IC_PIC24F16KA102-I/SS
designator IC?, comment PIC24F16KA102
MCU; 16bit; 32MHz; 16 KB Flash; 1.5 KB RAM; Manufacturer: Microchip; pro-environment: RoHS; Quality: -40~85¡æ; Value: 16bit MCU;32MHz;16 KB Flash, 1.5 KB RAM; OPN: PIC24F16KA102-I/SS; PadsNum: 0; SN: SN; Category: ¼¯³ÉÐ¾Æ¬; Part: PIC24F16KA102; QTY: 47; Price: 16.5204; OPN_JLC: OPN_JLC; SN_JLC: SN_JLC; Price_JLC: 0
footprint SSOP-28_W5.3 (SSOP, Plastic; 28 Leads; Body Width 5.3 mm; Pitch 0.65 mm)
pins: 1 ~{MCLR}/VPP/RA5 (io), 2 AN0/VREF+/CN2/RA0 (io), 3 AN1/VREF-/CN3/RA1 (io), 4 PGD1/AN2/C1IND/C2INB/U2TX/CN4/RB0 (io), 5 PGC1/AN3/C1INC/C2INA/U2RX/U2BCLK/CN5/RB1 (io), 6 AN4/C1INB/C2IND/U1RX/U1BCLK/CN6/RB2 (io), 7 AN5/C1INA/C2INC/CN7/RB3 (io), 8 VSS (power), 9 OSCI/CLKI/CN30/RA2 (io), 10 OSCO/CLKO/CN29/RA3 (io), 11 SOSCI/~{U2RTS}/CN1/RB4 (io), 12 SOSCO/T1CK/~{U2CTS}/CN0/RA4 (io), 13 VDD (power), 14 PGD3/SDA1/CN27/RB5 (io), 15 PGC3/SCL1/CN24/RB6 (io), 16 U1TX/INT0/CN23/RB7 (io), 17 ~{U1CTS}/SCL1/CN22/RB8 (io), 18 ~{U1RTS}/SDA1/CN21/RB9 (io), 19 IC1/CN9/RA7 (io), 20 OC1/C2OUT/INT2/CTED1/CN8/RA6 (io), 21 PGD2/SDI1/PMD2/CN16/RB10 (io), 22 PGC2/SCK1/CN15/RB11 (io), 23 AN12/HLVDIN/CTED2/CN14/RB12 (io), 24 AN11/SDO1/CTPLS/CN13/RB13 (io), 25 AN10/CVREF/RTCC/OCFA/C1OUT/INT1/CN12/RB14 (io), 26 REFO/~{SS1}/T2CK/T3CK/CN11/RB15 (io), 27 VSS (power), 28 VDD (power)

## IC_PL2303SA
designator IC?, comment PL2303
USB Bridge; 4.5~6.5V; Manufacturer: Prolific; Quality: -40~125¡æ; pro-environment: RoHS; SN: 03.4.11.17.82821601S; other: Vin=-4.5V~6.5V; OPN: PL2303SA; PadsNum: 0; Value: 4.5~6.5V; Category: ¼¯³ÉÐ¾Æ¬; Part: PL2303; Price: ?; OPN_JLC: OPN_JLC; SN_JLC: SN_JLC; Price_JLC: 0
footprint SO-8 (SOIC, 8-Leads, Body 4.9x3.9mm, Pitch 1.27mm, IPC Low Density)
pins: 1 GND (power), 2 TXD (out), 3 V325 (power), 4 RXD (in), 5 DP (io), 6 DM (io), 7 V5 (power), 8 V33 (power)
text: USB<-->TTL

## IC_PS2801-1
designator IC?, comment PS2801-1
Í¨ÓÃ¹âñî; Manufacturer: NEC; pro-environment: RoHS; Quality: -55~100¡æ; SN: 03.4.23.11.47280101S; OPN: PS2801-1-F3; PadsNum: 0; part: PS2801-1; Price: 2.0592; QTY: 3500; OPN_JLC: OPN_JLC; SN_JLC: SN_JLC; Price_JLC: 0
footprint SO-4 (SSOP-4£¬Pitch=50mil¡£ÈçPS2801-1)
pins: 1 A "Anode", 2 K "Cathode", 3 E "Emitter", 4 C "Collector"

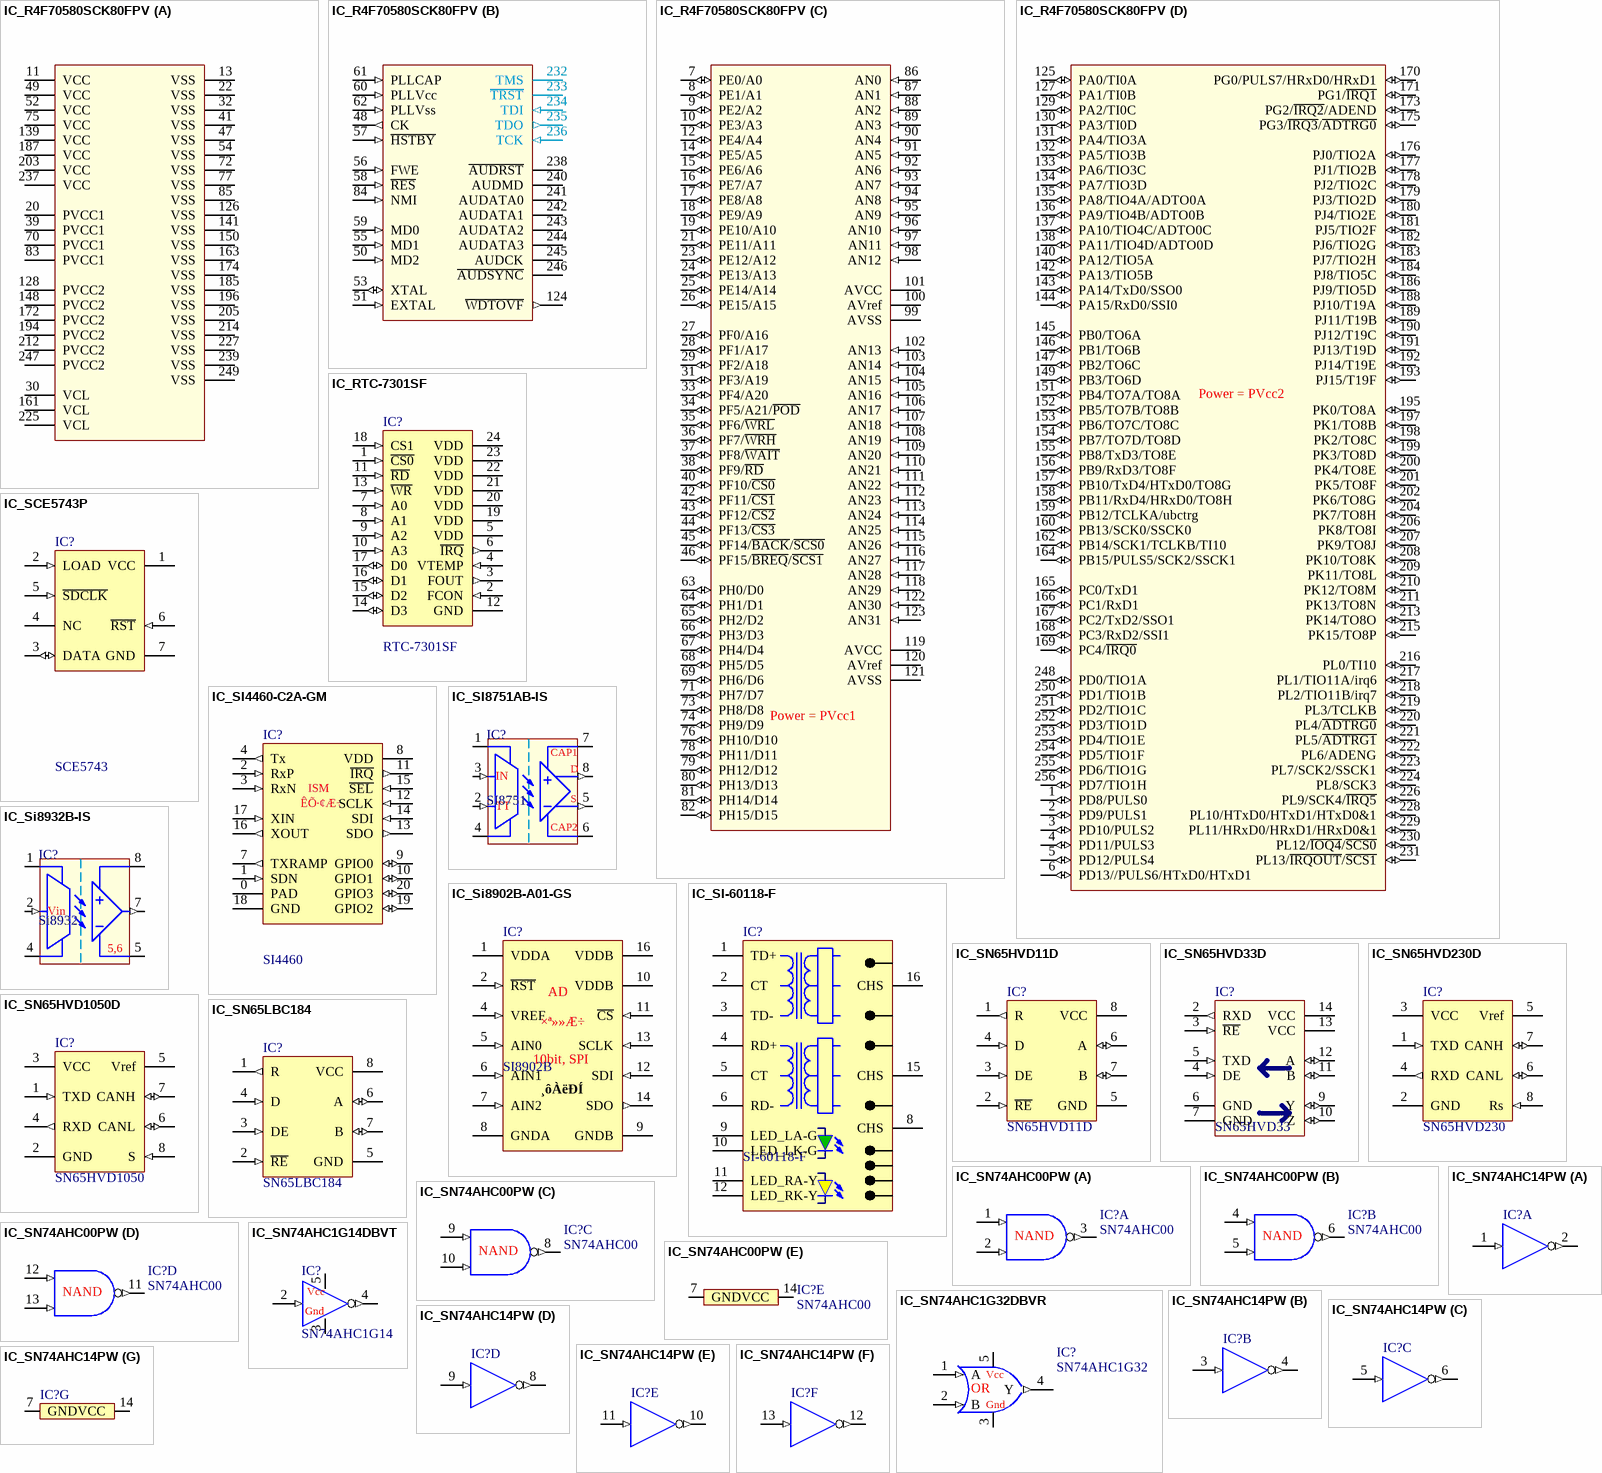
[diagram p17: symbols IC_R4F70580SCK80FPV to IC_SN74AHC14PW]

## IC_R4F70580SCK80FPV
designator IC?, comment SH7058H  (value not drawn)
MCU; 32bit; Manufacturer: Renesas; Quality: -55¡æ~125¡æ; Other: ´¦ÀíÆ÷; SN: 03.4.11.26.70705802S; pre-environment: RoHS; OPN: R4F70580SCK80FPV; PadsNum: 0; part: SH7058H; Price: ?; OPN_JLC: OPN_JLC; SN_JLC: SN_JLC; Price_JLC: 0
footprint SH7058S
part A pins: 11 VCC (power), 13 VSS (power), 20 PVCC1 (power), 22 VSS (power), 30 VCL (power), 32 VSS (power), 39 PVCC1 (power), 41 VSS (power), 47 VSS (power), 49 VCC (power), 52 VCC (power), 54 VSS (power), 70 PVCC1 (power), 72 VSS (power), 75 VCC (power), 77 VSS (power), 83 PVCC1 (power), 85 VSS (power), 126 VSS (power), 128 PVCC2 (power), 139 VCC (power), 141 VSS (power), 148 PVCC2 (power), 150 VSS (power), 161 VCL (power), 163 VSS (power), 172 PVCC2 (power), 174 VSS (power), 185 VSS (power), 187 VCC (power), 194 PVCC2 (power), 196 VSS (power), 203 VCC (power), 205 VSS (power), 212 PVCC2 (power), 214 VSS (power), 225 VCL (power), 227 VSS (power), 237 VCC (power), 239 VSS (power), 247 PVCC2 (power), 249 VSS (power)
part B pins: 48 CK (out), 50 MD2 (in), 51 EXTAL (in), 53 XTAL (io), 55 MD1 (in), 56 FWE (in), 57 ~{HSTBY} (in), 58 ~{RES} (in), 59 MD0 (in), 60 PLLVcc (in), 61 PLLCAP (in), 62 PLLVss (in), 84 NMI (in), 124 ~{WDTOVF} (out), 232 TMS, 233 ~{TRST}, 234 TDI (in), 235 TDO (out), 236 TCK (in), 238 ~{AUDRST}, 240 AUDMD, 241 AUDATA0, 242 AUDATA1, 243 AUDATA2, 244 AUDATA3, 245 AUDCK, 246 ~{AUDSYNC}
part C pins: 7 PE0/A0 (io), 8 PE1/A1 (io), 9 PE2/A2 (io), 10 PE3/A3 (io), 12 PE4/A4 (io), 14 PE5/A5 (io), 15 PE6/A6 (io), 16 PE7/A7 (io), 17 PE8/A8 (io), 18 PE9/A9 (io), 19 PE10/A10 (io), 21 PE11/A11 (io), 23 PE12/A12 (io), 24 PE13/A13 (io), 25 PE14/A14 (io), 26 PE15/A15 (io), 27 PF0/A16 (io), 28 PF1/A17 (io), 29 PF2/A18 (io), 31 PF3/A19 (io), 33 PF4/A20 (io), 34 PF5/A21/~{POD} (io), 35 PF6/~{WRL} (io), 36 PF7/~{WRH} (io), 37 PF8/~{WAIT} (io), 38 PF9/~{RD} (io), 40 PF10/~{CS0} (io), 42 PF11/~{CS1} (io), 43 PF12/~{CS2} (io), 44 PF13/~{CS3} (io), 45 PF14/~{BACK}/~{SCS0} (io), 46 PF15/~{BREQ}/~{SCS1} (io), 63 PH0/D0 (io), 64 PH1/D1 (io), 65 PH2/D2 (io), 66 PH3/D3 (io), 67 PH4/D4 (io), 68 PH5/D5 (io), 69 PH6/D6 (io), 71 PH7/D7 (io), 73 PH8/D8 (io), 74 PH9/D9 (io), 76 PH10/D10 (io), 78 PH11/D11 (io), 79 PH12/D12 (io), 80 PH13/D13 (io), 81 PH14/D14 (io), 82 PH15/D15 (io), 86 AN0 (in), 87 AN1 (in), 88 AN2 (in), 89 AN3 (in), 90 AN4 (in), 91 AN5 (in), 92 AN6 (in), 93 AN7 (in), 94 AN8 (in), 95 AN9 (in), 96 AN10 (in), 97 AN11 (in), 98 AN12 (in), 99 AVSS (power), 100 AVref (power), 101 AVCC (power), 102 AN13 (in), 103 AN14 (in), 104 AN15 (in), 105 AN16 (in), 106 AN17 (in), 107 AN18 (in), 108 AN19 (in), 109 AN20 (in), 110 AN21 (in), 111 AN22 (in), 112 AN23 (in), 113 AN24 (in), 114 AN25 (in), 115 AN26 (in), 116 AN27 (in), 117 AN28 (in), 118 AN29 (in), 119 AVCC (power), 120 AVref (power), 121 AVSS (power), 122 AN30 (in), 123 AN31 (in)
part D pins: 1 PD8/PULS0 (io), 2 PD9/PULS1 (io), 3 PD10/PULS2 (io), 4 PD11/PULS3 (io), 5 PD12/PULS4 (io), 6 PD13//PULS6/HTxD0/HTxD1 (io), 125 PA0/TI0A (io), 127 PA1/TI0B (io), 129 PA2/TI0C (io), 130 PA3/TI0D (io), 131 PA4/TIO3A (io), 132 PA5/TIO3B (io), 133 PA6/TIO3C (io), 134 PA7/TIO3D (io), 135 PA8/TIO4A/ADTO0A (io), 136 PA9/TIO4B/ADTO0B (io), 137 PA10/TIO4C/ADTO0C (io), 138 PA11/TIO4D/ADTO0D (io), 140 PA12/TIO5A (io), 142 PA13/TIO5B (io), 143 PA14/TxD0/SSO0 (io), 144 PA15/RxD0/SSI0 (io), 145 PB0/TO6A (io), 146 PB1/TO6B (io), 147 PB2/TO6C (io), 149 PB3/TO6D (io), 151 PB4/TO7A/TO8A (io), 152 PB5/TO7B/TO8B (io), 153 PB6/TO7C/TO8C (io), 154 PB7/TO7D/TO8D (io), 155 PB8/TxD3/TO8E (io), 156 PB9/RxD3/TO8F (io), 157 PB10/TxD4/HTxD0/TO8G (io), 158 PB11/RxD4/HRxD0/TO8H (io), 159 PB12/TCLKA/ubctrg (io), 160 PB13/SCK0/SSCK0 (io), 162 PB14/SCK1/TCLKB/TI10 (io), 164 PB15/PULS5/SCK2/SSCK1 (io), 165 PC0/TxD1 (io), 166 PC1/RxD1 (io), 167 PC2/TxD2/SSO1 (io), 168 PC3/RxD2/SSI1 (io), 169 PC4/~{IRQ0} (io), 170 PG0/PULS7/HRxD0/HRxD1 (io), 171 PG1/~{IRQ1} (io), 173 PG2/~{IRQ2}/ADEND (io), 175 PG3/~{IRQ3}/~{ADTRG0} (io), 176 PJ0/TIO2A (io), 177 PJ1/TIO2B (io), 178 PJ2/TIO2C (io), 179 PJ3/TIO2D (io), 180 PJ4/TIO2E (io), 181 PJ5/TIO2F (io), 182 PJ6/TIO2G (io), 183 PJ7/TIO2H (io), 184 PJ8/TIO5C (io), 186 PJ9/TIO5D (io), 188 PJ10/T19A (io), 189 PJ11/T19B (io), 190 PJ12/T19C (io), 191 PJ13/T19D (io), 192 PJ14/T19E (io), 193 PJ15/T19F (io), 195 PK0/TO8A (io), 197 PK1/TO8B (io), 198 PK2/TO8C (io), 199 PK3/TO8D (io), 200 PK4/TO8E (io), 201 PK5/TO8F (io), 202 PK6/TO8G (io), 204 PK7/TO8H (io), 206 PK8/TO8I (io), 207 PK9/TO8J (io), 208 PK10/TO8K (io), 209 PK11/TO8L (io), 210 PK12/TO8M (io), 211 PK13/TO8N (io), 213 PK14/TO8O (io), 215 PK15/TO8P (io), 216 PL0/TI10 (io), 217 PL1/TIO11A/irq6 (io), 218 PL2/TIO11B/irq7 (io), 219 PL3/TCLKB (io), 220 PL4/~{ADTRG0} (io), 221 PL5/~{ADTRG1} (io), 222 PL6/ADENG (io), 223 PL7/SCK2/SSCK1 (io), 224 PL8/SCK3 (io), 226 PL9/SCK4/~{IRQ5} (io), 228 PL10/HTxD0/HTxD1/HTxD0&1 (io), 229 PL11/HRxD0/HRxD1/HRxD0&1 (io), 230 PL12/~{IOQ4}/~{SCS0} (io), 231 PL13/~{IRQOUT}/~{SCS1} (io), 248 PD0/TIO1A (io), 250 PD1/TIO1B (io), 251 PD2/TIO1C (io), 252 PD3/TIO1D (io), 253 PD4/TIO1E (io), 254 PD5/TIO1F (io), 255 PD6/TIO1G (io), 256 PD7/TIO1H (io)